# Altium footprint library CUSTOM PCB.PcbLib: 404 footprints (part 22 of 26)
Each footprint in its own frame and in the unit in brackets; x right, y up, seen from the top. Pads: shape width x height; smd on the part's side, far side on the other; paste and mask are expansions set on the pad; w line width, h text height; cw(c..) or ccw(c..) is an arc to the next point about the centre after c.
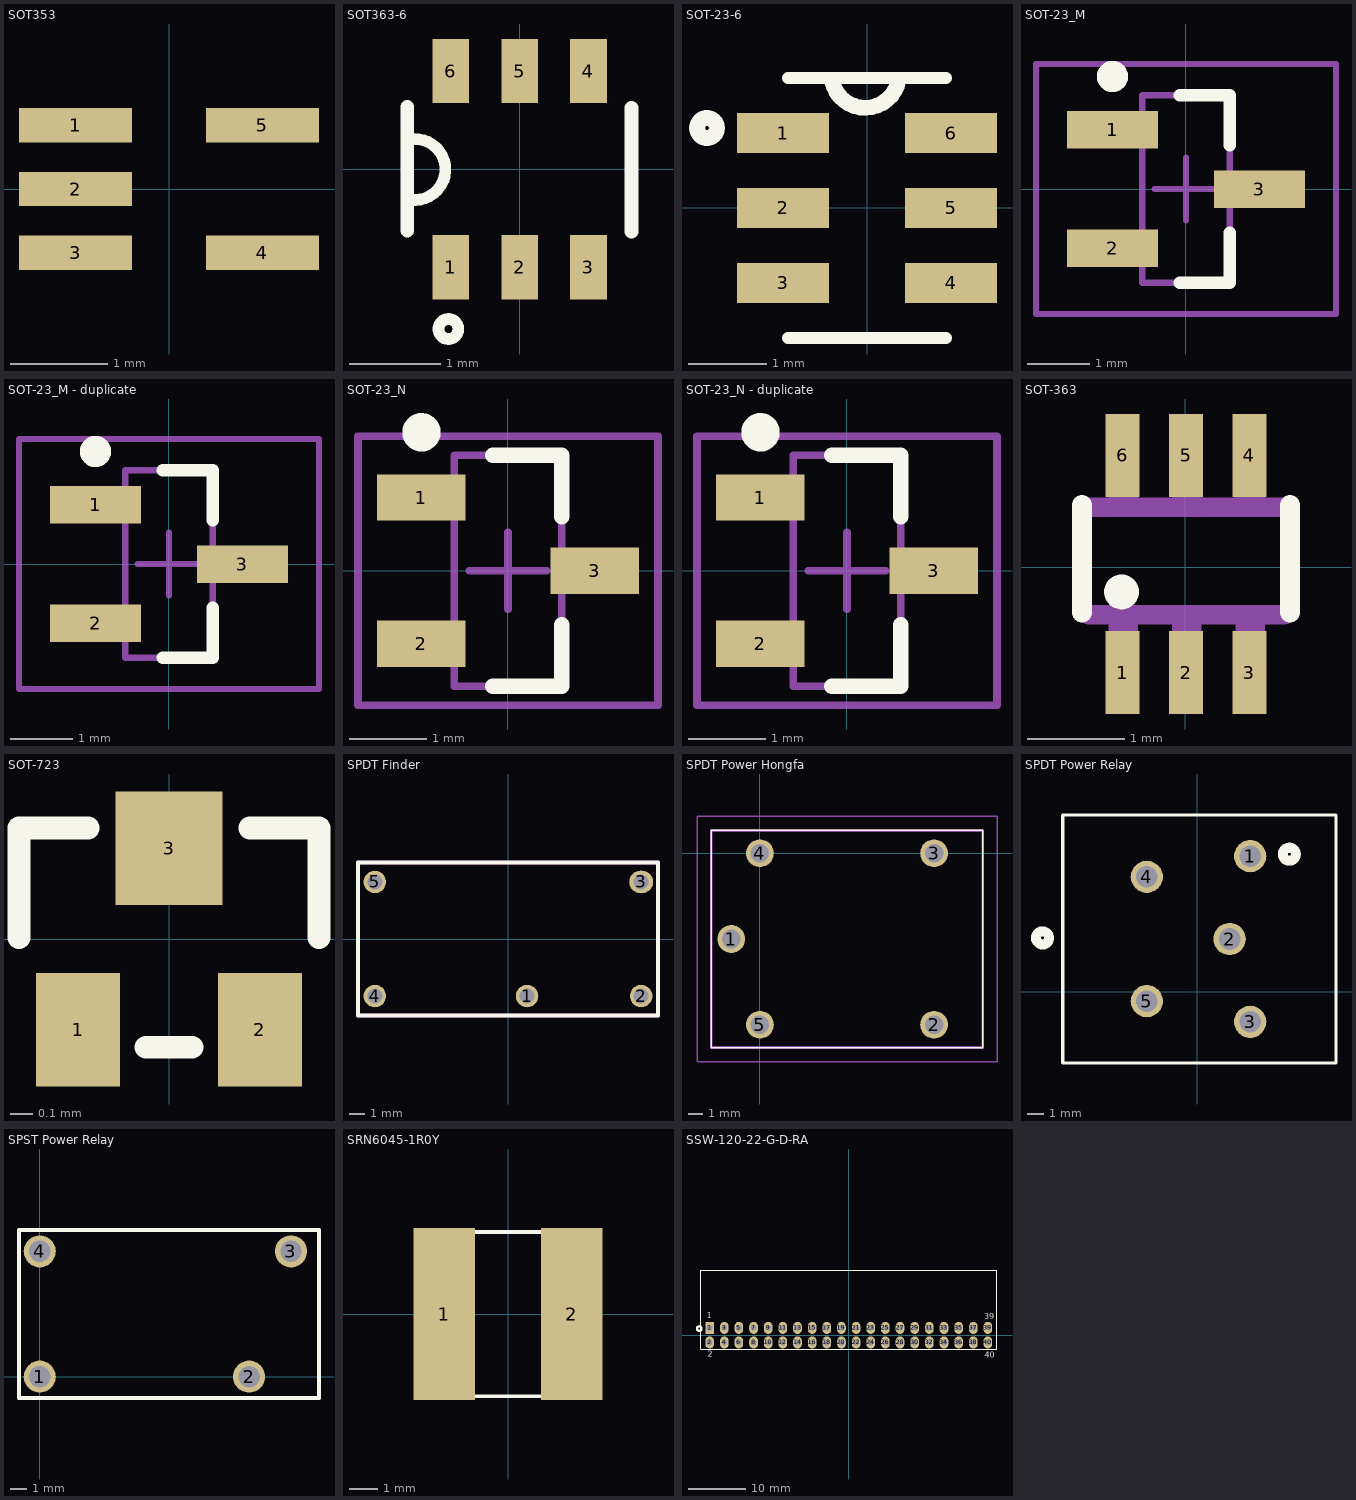
[diagram p21: the footprints below, top view; thin cyan lines are the x and y axes]

## SOT353 [mil]
pads (5):
  rect 46x14 smd: 1(-38,26) 2(-38,0) 3(-38,-26) 4(38,-26) 5(38,26)
3D body "User Library-sot353.step": height 39.37, standoff 0, extent -45.28,-41.34 45.28,41.34

## SOT363-6 [mm]
pads (6):
  rect 0.4x0.7 smd: 1(-0.75,-1.07) 2(0,-1.07) 3(0.75,-1.07) 4(0.75,1.07) 5(0,1.07) 6(-0.75,1.07)
Top Overlay:
  circle w0.127: c-0.777,-1.743 r0.109
  lines w0.127: -1.219,0.32 cw(c-1.142,-0.003) -1.196,-0.331
  lines w0.15: -1.225,-0.67 -1.225,0.68 ; 1.22,-0.68 1.22,0.67
3D body "SOT363-2.STEP": height 1, standoff -0.1, extent -1.1,-1.2 1.1,1.2

## SOT-23-6 [mil]
pads (6):
  rect 46x20 smd paste+0 mask+0: 1(-42,37.4) 2(-42,0) 3(-42,-37.4) 4(42,-37.4) 5(42,0) 6(42,37.4)
Top Overlay:
  circle w7.87: c-80,40 r5
  lines w6: -39.5,-65 39.5,-65 ; -39.5,65 39.5,65
  lines w7.87: -17.47,63.4 ccw(c-0.91,67.04) 15.8,64.18
3D body "DBV6.step": height 57.09, standoff 0, extent -59.01,-60 59.01,60

## SOT-23_M [mm] "SOT23, 3-Leads, Body 2.9x1.3mm, Pitch 0.95mm, Lead Span 2.5mm, IPC Low Density"
height 1.1
pads (3):
  rect 1.45x0.6 smd: 1(-1.175,0.95) 2(-1.175,-0.95) 3(1.175,0)
Top Overlay:
  circle w0.25: c-1.175,1.8 r0.125
  lines w0.2: -0.1,-1.5 0.7,-1.5 0.7,-0.7 ; -0.1,1.5 0.7,1.5 0.7,0.7
Mechanical 13:
  lines w0.1: -0.7,-1.5 -0.7,1.5 0.7,1.5 0.7,-1.5 -0.7,-1.5
Mechanical 15:
  lines w0.1: -0.5,0 0.5,0 ; 0,-0.5 0,0.5 ; -2.4,-2 -2.4,2 2.4,2 2.4,-2 -2.4,-2
3D body "SOT23-3.stp": height 1.2, standoff 0.02, extent -1.418,-1.5 1.418,1.5

## SOT-23_M - duplicate [mm] "SOT23, 3-Leads, Body 2.9x1.3mm, Pitch 0.95mm, Lead Span 2.5mm, IPC Low Density"
height 1.1
pads (3):
  rect 1.45x0.6 smd: 1(-1.175,0.95) 2(-1.175,-0.95) 3(1.175,0)
Top Overlay:
  circle w0.25: c-1.175,1.8 r0.125
  lines w0.2: -0.1,-1.5 0.7,-1.5 0.7,-0.7 ; -0.1,1.5 0.7,1.5 0.7,0.7
Mechanical 13:
  lines w0.1: -0.7,-1.5 0.7,-1.5 0.7,1.5 -0.7,1.5 -0.7,-1.5
Mechanical 15:
  lines w0.1: -0.5,0 0.5,0 ; 0,-0.5 0,0.5 ; -2.4,-2 2.4,-2 2.4,2 -2.4,2 -2.4,-2
3D body "SOT23-3.stp": height 1.2, standoff 0.02, extent -1.418,-1.5 1.418,1.5

## SOT-23_N [mm] "SOT23, 3-Leads, Body 2.9x1.3mm, Pitch 0.95mm, Lead Span 2.5mm, IPC Medium Density"
height 1.1
pads (3):
  rect 1.15x0.6 smd: 1(-1.125,0.95) 2(-1.125,-0.95) 3(1.125,0)
Top Overlay:
  circle w0.25: c-1.125,1.8 r0.125
  lines w0.2: -0.2,-1.5 0.7,-1.5 0.7,-0.7 ; -0.2,1.5 0.7,1.5 0.7,0.7
Mechanical 13:
  lines w0.1: -0.7,-1.5 -0.7,1.5 0.7,1.5 0.7,-1.5 -0.7,-1.5
Mechanical 15:
  lines w0.1: -0.5,0 0.5,0 ; 0,-0.5 0,0.5 ; -1.95,-1.75 -1.95,1.75 1.95,1.75 1.95,-1.75 -1.95,-1.75
3D body "SOT23-3.stp": height 1.2, standoff 0.02, extent -1.418,-1.5 1.418,1.5

## SOT-23_N - duplicate [mm] "SOT23, 3-Leads, Body 2.9x1.3mm, Pitch 0.95mm, Lead Span 2.5mm, IPC Medium Density"
height 1.1
pads (3):
  rect 1.15x0.6 smd: 1(-1.125,0.95) 2(-1.125,-0.95) 3(1.125,0)
Top Overlay:
  circle w0.25: c-1.125,1.8 r0.125
  lines w0.2: -0.2,-1.5 0.7,-1.5 0.7,-0.7 ; -0.2,1.5 0.7,1.5 0.7,0.7
Mechanical 13:
  lines w0.1: -0.7,-1.5 -0.7,1.5 0.7,1.5 0.7,-1.5 -0.7,-1.5
Mechanical 15:
  lines w0.1: -0.5,0 0.5,0 ; 0,-0.5 0,0.5 ; -1.95,-1.75 -1.95,1.75 1.95,1.75 1.95,-1.75 -1.95,-1.75
3D body "SOT23-3.stp": height 1.2, standoff 0.02, extent -1.418,-1.5 1.418,1.5

## SOT-363 [mm]
pads (6):
  rect 0.35x0.85 smd: 1(-0.642,-1.079) 2(0.008,-1.079) 3(0.658,-1.079) 4(0.658,1.143) 5(0.008,1.143) 6(-0.642,1.143)
Top Overlay:
  circle w0.254: c-0.652,-0.254 r0.051
  lines w0.203: -1.059,-0.465 -1.059,0.635 ; 1.075,-0.465 1.075,0.635
Mechanical 4:
  region: -0.784,-0.537 -0.484,-0.537 -0.484,-1.037 -0.784,-1.037
  region: -0.134,-0.537 0.166,-0.537 0.166,-1.037 -0.134,-1.037
  region: 0.516,-0.537 0.816,-0.537 0.816,-1.037 0.516,-1.037
  region: 0.516,1.163 0.816,1.163 0.816,0.663 0.516,0.663
  region: -0.134,1.163 0.166,1.163 0.166,0.663 -0.134,0.663
  region: -0.784,1.163 -0.484,1.163 -0.484,0.663 -0.784,0.663
  region: -0.784,-0.537 -0.484,-0.537 -0.484,-1.037 -0.784,-1.037
  region: -0.134,-0.537 0.166,-0.537 0.166,-1.037 -0.134,-1.037
  region: 0.516,-0.537 0.816,-0.537 0.816,-1.037 0.516,-1.037
  region: 0.516,1.163 0.816,1.163 0.816,0.663 0.516,0.663
  region: -0.134,1.163 0.166,1.163 0.166,0.663 -0.134,0.663
  region: -0.784,1.163 -0.484,1.163 -0.484,0.663 -0.784,0.663
  lines w0.203: -0.984,-0.487 1.016,-0.487 -0.984,-0.487 ; -0.984,0.613 1.016,0.613 -0.984,0.613
3D body "SOT363-2.STEP": height 1.1, standoff 0, extent -1.1,-1.2 1.1,1.2

## SOT-723 [mm]
pads (3):
  rect 0.37x0.5 smd mask+0.05: 1(-0.4,-0.4) 2(0.4,-0.4)
  rect 0.47x0.5 smd mask+0.05: 3(0,0.4)
Top Overlay:
  lines w0.1: -0.66,0.006 -0.66,0.489 -0.356,0.489 ; -0.102,-0.476 0.102,-0.476 ; 0.356,0.489 0.66,0.489 0.66,0.006
3D body "User Library-SOT-723.step": height 0.45, standoff -0.01, extent -0.61,-0.525 0.64,0.525

## SPDT Finder [mm] "Socket PCB Relay"
pads (5):
  round 1.5 hole 1: 1(1.27,-3.81) 2(8.89,-3.81) 4(-8.89,-3.81) 5(-8.89,3.81)
  oval 1.6x1.5 hole 1: 3(8.89,3.81)
Top Overlay:
  lines w0.254: -10.015,-5.1 -10.015,5.1 10.015,5.1 10.015,-5.1 -10.015,-5.1
Mechanical 13:
  lines w0.254: -10.015,-5.1 10.015,-5.1 10.015,5.1 -10.015,5.1 -10.015,-5.1
3D body "3221.stp": height 10.3, standoff -3.2, extent -9.997,-5.102 10.203,4.998

## SPDT Power Hongfa [mm]
pads (5):
  round 1.95 hole 1.3: 1(-2,-6) 2(12.2,-12) 3(12.2,0) 4(0,0) 5(0,-12)
Top Overlay:
  lines w0.1: -3.4,-13.6 -3.4,1.6 15.6,1.6 15.6,-13.6 -3.4,-13.6
Mechanical 15:
  lines w0.2: -3.4,-13.6 -3.4,1.6 15.6,1.6 15.6,-13.6 -3.4,-13.6
Mechanical 20:
  lines w0.1: -4.4,-14.6 -4.4,2.6 16.6,2.6 16.6,-14.6 -4.4,-14.6
3D body: height 15.49, standoff 0, extent -3.425,-13.62 15.625,1.62

## SPDT Power Relay [mm] "SPDT 15x15"
pads (5):
  round 1.95 hole 1.3: 1(3.2,8.204) 2(1.956,3.2) 3(3.2,-1.803) 4(-3.048,6.96) 5(-3.048,-0.555)
Top Overlay:
  circle w0.6: c5.563,8.322 r0.395
  circle w0.6: c-9.347,3.267 r0.395
  lines w0.2: -8.128,-4.293 8.382,-4.293 8.382,10.693 -8.128,10.693 -8.128,-4.293
3D body: height 20, standoff 0, extent -8.128,-4.318 8.382,10.668

## SPST Power Relay [mm]
pads (4):
  round 1.95 hole 1.3: 1(0,0) 2(12.7,0) 3(15.24,7.6) 4(0,7.6)
Top Overlay:
  lines w0.254: -1.26,-1.3 -1.26,8.9 16.94,8.9 16.94,-1.3 -1.26,-1.3
Mechanical 15:
  lines w0.254: -1.26,-1.3 16.94,-1.3 16.94,8.9 -1.26,8.9 -1.26,-1.3
3D body: height 14.7, standoff 0, extent -1.27,-1.27 16.891,8.89

## SPST-T77S1D10-05 [mm] "power Relay"

## SRN6045-1R0Y [mm]
pads (2):
  rect 2.15x6 smd: 1(-2.225,0) 2(2.225,0)
Top Overlay:
  lines w0.127: -2.868,-2.868 2.841,-2.868 ; -2.868,2.855 2.841,2.855
3D body "STEP-WE-PD2-5848-rev1.stp": height 4.5, standoff 0, extent -2.894,-2.6 2.894,2.6

## SSW-120-22-G-D-RA [mm]
pads (40):
  rect 1.5x2.1 hole 1: 1(-24.13,1.27)
  oval 1.5x2.1 hole 1: 2(-24.13,-1.27) 3(-21.59,1.27) 4(-21.59,-1.27) 5(-19.05,1.27) 6(-19.05,-1.27) 7(-16.51,1.27) 8(-16.51,-1.27) 9(-13.97,1.27) 10(-13.97,-1.27) 11(-11.43,1.27) 12(-11.43,-1.27) 13(-8.89,1.27) 14(-8.89,-1.27) 15(-6.35,1.27) 16(-6.35,-1.27) 17(-3.81,1.27) 18(-3.81,-1.27) 19(-1.27,1.27) 20(-1.27,-1.27) 21(1.27,1.27) 22(1.27,-1.27) 23(3.81,1.27) 24(3.81,-1.27) 25(6.35,1.27) 26(6.35,-1.27) 27(8.89,1.27) 28(8.89,-1.27) 29(11.43,1.27) 30(11.43,-1.27) 31(13.97,1.27) 32(13.97,-1.27) 33(16.51,1.27) 34(16.51,-1.27) 35(19.05,1.27) 36(19.05,-1.27) 37(21.59,1.27) 38(21.59,-1.27) 39(24.13,1.27) 40(24.13,-1.27)
Top Overlay:
  circle w0.4: c-25.933,1.143 r0.387
  lines w0.1: -25.705,-2.464 -25.705,11.252 25.705,11.252 25.705,-2.464 -25.705,-2.464
  text "1" at -24.638,2.972 h1.02
  text "2" at -24.486,-3.734 h1.02
  text "40" at 23.546,-3.912 h1.02
  text "39" at 23.495,2.769 h1.02
3D body "SSW-120-22-G-D-RA.x_t": height 4.98, standoff -2.5, extent -25.654,-1.578 25.654,11.198